# Altium footprint library MyPcbLib.PcbLib: 657 footprints (part 28 of 42)
Each footprint in its own frame and in the unit in brackets; x right, y up, seen from the top. Pads: shape width x height; smd on the part's side, far side on the other; paste and mask are expansions set on the pad; w line width, h text height; cw(c..) or ccw(c..) is an arc to the next point about the centre after c.
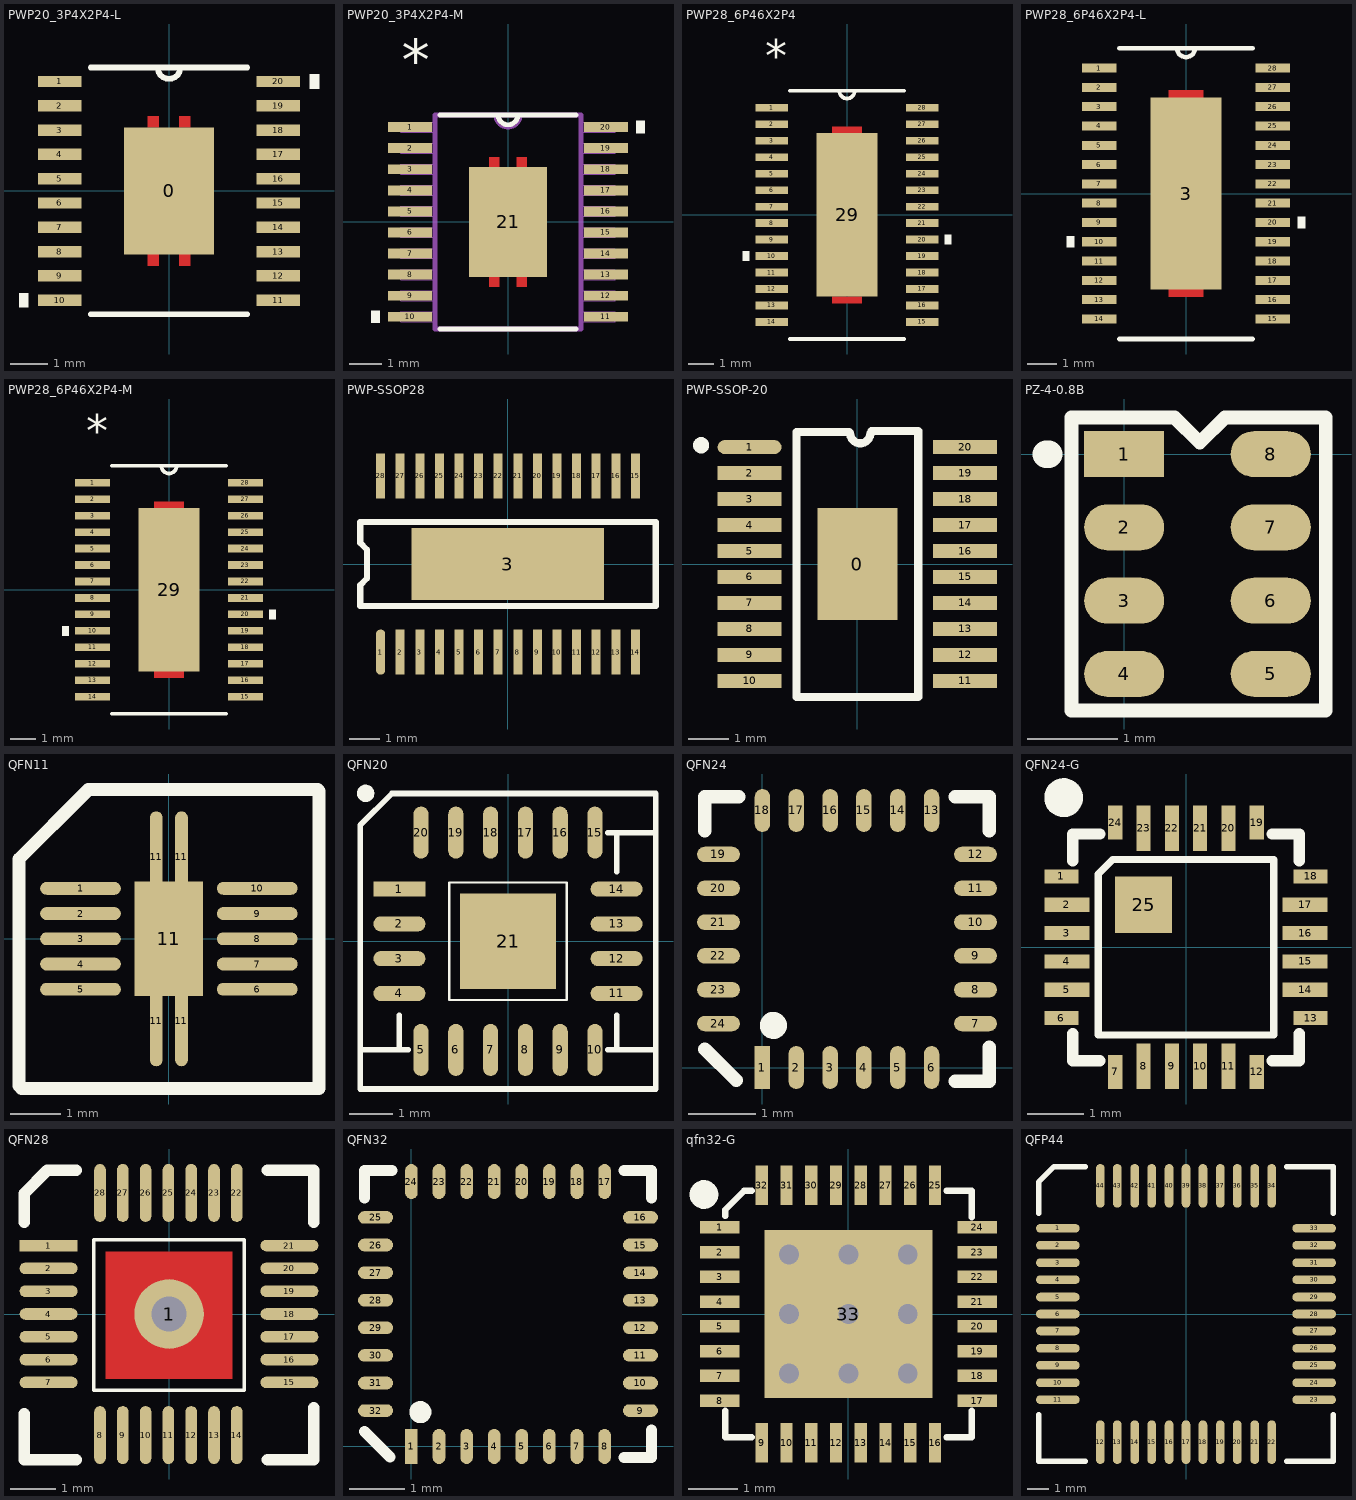
[diagram p27: the footprints below, top view; thin cyan lines are the x and y axes]

## PWP20_3P4X2P4-L [mil]
height 100
pads (21):
  rect 94.49x133.86 smd: 0(0,0)
  rect 46x12 smd: 1(-115,115.16) 2(-115,89.57) 3(-115,63.98) 4(-115,38.39) 5(-115,12.8) 6(-115,-12.8) 7(-115,-38.39) 8(-115,-63.98) 9(-115,-89.57) 10(-115,-115.16) 11(115,-115.16) 12(115,-89.57) 13(115,-63.98) 14(115,-38.39) 15(115,-12.8) 16(115,12.8) 17(115,38.39) 18(115,63.98) 19(115,89.57) 20(115,115.16)
Top Layer:
  region: 22.64,-66.93 10.83,-66.93 10.83,-78.74 22.64,-78.74
  region: -22.64,-66.93 -10.83,-66.93 -10.83,-78.74 -22.64,-78.74
  region: -22.64,66.93 -10.83,66.93 -10.83,78.74 -22.64,78.74
  region: 22.64,66.93 10.83,66.93 10.83,78.74 22.64,78.74
  region: 0,-66.93
  region: 0,66.93
Top Overlay:
  region: 148,122.66 158,122.66 158,107.66 148,107.66
  region: -148,-107.66 -158,-107.66 -158,-122.66 -148,-122.66
  lines w6: -82.33,-130 82.33,-130 ; -82.33,130 82.33,130 ; -12,130 ccw(c0,130) 12,130
Top Solder:
  region: 22.64,-66.93 10.83,-66.93 10.83,-78.74 22.64,-78.74
  region: -22.64,-66.93 -10.83,-66.93 -10.83,-78.74 -22.64,-78.74
  region: -22.64,66.93 -10.83,66.93 -10.83,78.74 -22.64,78.74
  region: 22.64,66.93 10.83,66.93 10.83,78.74 22.64,78.74
  region: 0,-66.93
  region: 0,66.93

## PWP20_3P4X2P4-M [mil]
height 100
pads (21):
  rect 54x12 smd: 1(-119,115.16) 2(-119,89.57) 3(-119,63.98) 4(-119,38.39) 5(-119,12.8) 6(-119,-12.8) 7(-119,-38.39) 8(-119,-63.98) 9(-119,-89.57) 10(-119,-115.16) 11(119,-115.16) 12(119,-89.57) 13(119,-63.98) 14(119,-38.39) 15(119,-12.8) 16(119,12.8) 17(119,38.39) 18(119,63.98) 19(119,89.57) 20(119,115.16)
  rect 94.49x133.86 smd: 21(0,0)
Top Layer:
  region: 0,66.93
  region: 0,-66.93
  region: 22.64,66.93 10.83,66.93 10.83,78.74 22.64,78.74
  region: -22.64,66.93 -10.83,66.93 -10.83,78.74 -22.64,78.74
  region: -22.64,-66.93 -10.83,-66.93 -10.83,-78.74 -22.64,-78.74
  region: 22.64,-66.93 10.83,-66.93 10.83,-78.74 22.64,-78.74
Top Overlay:
  region: -156,-107.66 -166,-107.66 -166,-122.66 -156,-122.66
  region: 156,122.66 166,122.66 166,107.66 156,107.66
  lines w6: -82.33,-130 82.33,-130 ; -82.33,130 82.33,130 ; -12,130 ccw(c0,130) 12,130
  text "*" at -129,172.16 h50
Top Solder:
  region: 0,66.93
  region: 0,-66.93
  region: 22.64,66.93 10.83,66.93 10.83,78.74 22.64,78.74
  region: -22.64,66.93 -10.83,66.93 -10.83,78.74 -22.64,78.74
  region: -22.64,-66.93 -10.83,-66.93 -10.83,-78.74 -22.64,-78.74
  region: 22.64,-66.93 10.83,-66.93 10.83,-78.74 22.64,-78.74
Mechanical 1:
  lines w0: -12,130 ccw(c0,130) 12,130 ; -130,-121.16 -130,-109.16 -88.5,-109.16 -88.5,-121.16 -130,-121.16 ; -130,-95.57 -130,-83.57 -88.5,-83.57 -88.5,-95.57 -130,-95.57 ; -130,-69.98 -130,-57.98 -88.5,-57.98 -88.5,-69.98 -130,-69.98 ; -130,-44.39 -130,-32.39 -88.5,-32.39 -88.5,-44.39 -130,-44.39 ; -130,-18.8 -130,-6.8 -88.5,-6.8 -88.5,-18.8 -130,-18.8 ; -130,6.8 -130,18.8 -88.5,18.8 -88.5,6.8 -130,6.8 ; -130,32.39 -130,44.39 -88.5,44.39 -88.5,32.39 -130,32.39 ; -130,57.98 -130,69.98 -88.5,69.98 -88.5,57.98 -130,57.98 ; -130,83.57 -130,95.57 -88.5,95.57 -88.5,83.57 -130,83.57 ; -130,109.16 -130,121.16 -88.5,121.16 -88.5,109.16 -130,109.16 ; -88.5,-130 88.5,-130 88.5,130 -88.5,130 -88.5,-130 ; 88.5,-121.16 88.5,-109.16 130,-109.16 130,-121.16 88.5,-121.16 ; 88.5,-95.57 88.5,-83.57 130,-83.57 130,-95.57 88.5,-95.57 ; 88.5,-69.98 88.5,-57.98 130,-57.98 130,-69.98 88.5,-69.98 ; 88.5,-44.39 88.5,-32.39 130,-32.39 130,-44.39 88.5,-44.39 ; 88.5,-18.8 88.5,-6.8 130,-6.8 130,-18.8 88.5,-18.8 ; 88.5,6.8 88.5,18.8 130,18.8 130,6.8 88.5,6.8 ; 88.5,32.39 88.5,44.39 130,44.39 130,32.39 88.5,32.39 ; 88.5,57.98 88.5,69.98 130,69.98 130,57.98 88.5,57.98 ; 88.5,83.57 88.5,95.57 130,95.57 130,83.57 88.5,83.57 ; 88.5,109.16 88.5,121.16 130,121.16 130,109.16 88.5,109.16
  lines w6: -14.75,130 ccw(c0,130) 14.75,130 ; -88.5,-130 -88.5,130 88.5,130 88.5,-130 -88.5,-130
  text "*" at -129,172.16 h50
  text "100" at 0,0 h50

## PWP28_6P46X2P4 [mil]
height 100
pads (29):
  rect 50x12 smd: 1(-117,166.34) 2(-117,140.75) 3(-117,115.16) 4(-117,89.57) 5(-117,63.98) 6(-117,38.39) 7(-117,12.8) 8(-117,-12.8) 9(-117,-38.39) 10(-117,-63.98) 11(-117,-89.57) 12(-117,-115.16) 13(-117,-140.75) 14(-117,-166.34) 15(117,-166.34) 16(117,-140.75) 17(117,-115.16) 18(117,-89.57) 19(117,-63.98) 20(117,-38.39) 21(117,-12.8) 22(117,12.8) 23(117,38.39) 24(117,63.98) 25(117,89.57) 26(117,115.16) 27(117,140.75) 28(117,166.34)
  rect 94.49x254.33 smd: 29(0,0)
Top Layer:
  region: 22.64,-127.17 -22.64,-127.17 -22.64,-137.01 22.64,-137.01 22.64,-127.17
  region: 22.64,127.17 -22.64,127.17 -22.64,137.01 22.64,137.01 22.64,127.17
Top Overlay:
  region: 152,-30.89 162,-30.89 162,-45.89 152,-45.89
  region: -152,-56.48 -162,-56.48 -162,-71.48 -152,-71.48
  lines w6: -88.5,-192.91 88.5,-192.91 ; -88.5,192.91 88.5,192.91 ; -12,192.91 ccw(c0,192.91) 12,192.91
  text "*" at -127,223.34 h50
Top Solder:
  region: 22.64,-127.17 -22.64,-127.17 -22.64,-137.01 22.64,-137.01 22.64,-127.17
  region: 22.64,127.17 -22.64,127.17 -22.64,137.01 22.64,137.01 22.64,127.17

## PWP28_6P46X2P4-L [mil]
height 100
pads (29):
  rect 46x12 smd: 1(-115,166.34) 2(-115,140.75) 3(-115,115.16) 4(-115,89.57) 5(-115,63.98) 6(-115,38.39) 7(-115,12.8) 8(-115,-12.8) 9(-115,-38.39) 10(-115,-63.98) 11(-115,-89.57) 12(-115,-115.16) 13(-115,-140.75) 14(-115,-166.34) 15(115,-166.34) 16(115,-140.75) 17(115,-115.16) 18(115,-89.57) 19(115,-63.98) 20(115,-38.39) 21(115,-12.8) 22(115,12.8) 23(115,38.39) 24(115,63.98) 25(115,89.57) 26(115,115.16) 27(115,140.75) 28(115,166.34)
  rect 94.49x254.33 smd: 3(0,0)
Top Layer:
  region: 22.64,127.17 -22.64,127.17 -22.64,137.01 22.64,137.01 22.64,127.17
  region: 22.64,-127.17 -22.64,-127.17 -22.64,-137.01 22.64,-137.01 22.64,-127.17
Top Overlay:
  region: -148,-56.48 -158,-56.48 -158,-71.48 -148,-71.48
  region: 148,-30.89 158,-30.89 158,-45.89 148,-45.89
  lines w6: -88.5,-192.91 88.5,-192.91 ; -88.5,192.91 88.5,192.91 ; -12,192.91 ccw(c0,192.91) 12,192.91
Top Solder:
  region: 22.64,127.17 -22.64,127.17 -22.64,137.01 22.64,137.01 22.64,127.17
  region: 22.64,-127.17 -22.64,-127.17 -22.64,-137.01 22.64,-137.01 22.64,-127.17

## PWP28_6P46X2P4-M [mil]
height 100
pads (29):
  rect 54x12 smd: 1(-119,166.34) 2(-119,140.75) 3(-119,115.16) 4(-119,89.57) 5(-119,63.98) 6(-119,38.39) 7(-119,12.8) 8(-119,-12.8) 9(-119,-38.39) 10(-119,-63.98) 11(-119,-89.57) 12(-119,-115.16) 13(-119,-140.75) 14(-119,-166.34) 15(119,-166.34) 16(119,-140.75) 17(119,-115.16) 18(119,-89.57) 19(119,-63.98) 20(119,-38.39) 21(119,-12.8) 22(119,12.8) 23(119,38.39) 24(119,63.98) 25(119,89.57) 26(119,115.16) 27(119,140.75) 28(119,166.34)
  rect 94.49x254.33 smd: 29(0,0)
Top Layer:
  region: 22.64,-127.17 -22.64,-127.17 -22.64,-137.01 22.64,-137.01 22.64,-127.17
  region: 22.64,127.17 -22.64,127.17 -22.64,137.01 22.64,137.01 22.64,127.17
Top Overlay:
  region: 156,-30.89 166,-30.89 166,-45.89 156,-45.89
  region: -156,-56.48 -166,-56.48 -166,-71.48 -156,-71.48
  lines w6: -88.5,-192.91 88.5,-192.91 ; -88.5,192.91 88.5,192.91 ; -12,192.91 ccw(c0,192.91) 12,192.91
  text "*" at -129,223.34 h50
Top Solder:
  region: 22.64,-127.17 -22.64,-127.17 -22.64,-137.01 22.64,-137.01 22.64,-127.17
  region: 22.64,127.17 -22.64,127.17 -22.64,137.01 22.64,137.01 22.64,127.17

## PWP-SSOP28 [mm]
pads (29):
  oval 0.3x1.5 smd: 1(-4.216,-2.921)
  rect 0.3x1.5 smd: 2(-3.566,-2.921) 3(-2.916,-2.921) 4(-2.266,-2.921) 5(-1.616,-2.921) 6(-0.966,-2.921) 7(-0.316,-2.921) 8(0.334,-2.921) 9(0.984,-2.921) 10(1.634,-2.921) 11(2.284,-2.921) 12(2.934,-2.921) 13(3.584,-2.921) 14(4.234,-2.921) 15(4.234,2.921) 16(3.584,2.921) 17(2.934,2.921) 18(2.284,2.921) 19(1.634,2.921) 20(0.984,2.921) 21(0.334,2.921) 22(-0.316,2.921) 23(-0.966,2.921) 24(-1.616,2.921) 25(-2.266,2.921) 26(-2.916,2.921) 27(-3.566,2.921) 28(-4.216,2.921)
  rect 6.4x2.4 smd: 3(0,0)
Top Overlay:
  lines w0.203: -4.891,-1.397 4.909,-1.397 4.909,1.397 -4.891,1.397 -4.891,0.699 -4.674,0.481 -4.674,-0.481 -4.891,-0.699 -4.891,-1.397

## PWP-SSOP-20 [mm]
pads (21):
  rect 2x2.8 smd: 0(0,0)
  oval 1.6x0.35 smd: 1(-2.696,2.925)
  rect 1.6x0.35 smd: 2(-2.696,2.275) 3(-2.696,1.625) 4(-2.696,0.975) 5(-2.696,0.325) 6(-2.696,-0.325) 7(-2.696,-0.975) 8(-2.696,-1.625) 9(-2.696,-2.275) 10(-2.696,-2.925) 11(2.696,-2.925) 12(2.696,-2.275) 13(2.696,-1.625) 14(2.696,-0.975) 15(2.696,-0.325) 16(2.696,0.325) 17(2.696,0.975) 18(2.696,1.625) 19(2.696,2.275) 20(2.696,2.925)
Top Overlay:
  circle w0.203: c-3.912,2.972 r0.102
  lines w0.203: -0.203,3.302 -1.524,3.302 -1.524,-3.327 1.524,-3.327 1.524,3.327 0.356,3.327 ; -0.181,3.277 ccw(c0.073,3.277) 0.327,3.277

## PZ-4-0.8B [mil]
height 9.5
pads (8):
  rect 35x20 smd: 1(0,0)
  oval 35x20 smd: 2(0,-32) 3(0,-64) 4(0,-96) 5(64,-96) 6(64,-64) 7(64,-32) 8(64,0)
Top Overlay:
  lines w6: -23,-112 88,-112 88,16 44,16 33,5 22,16 -23,16 -23,-112
  lines w12: -34,0 -33,0

## QFN11 [mm]
pads (15):
  oval 1.6x0.254 smd: 1(-1.75,1) 2(-1.75,0.5) 3(-1.75,0) 4(-1.75,-0.5) 5(-1.75,-1) 6(1.75,-1) 7(1.75,-0.5) 8(1.75,0) 9(1.75,0.5) 10(1.75,1)
  oval 0.254x1.8 smd: 11(-0.25,-1.625) 11(-0.25,1.625) 11(0.25,-1.625) 11(0.25,1.625)
  rect 1.36x2.27 smd: 11(0,0)
Top Overlay:
  lines w0.254: 2.593,-2.962 2.974,-2.962 2.974,2.905 ; 2.949,-2.937 2.924,-2.962 -2.918,-2.962 -2.969,-2.912 -2.969,1.584 -1.648,2.905 -1.598,2.956 2.949,2.956 2.974,2.93 2.974,2.753

## QFN20 [mm]
pads (21):
  rect 1.2x0.35 smd: 1(-2.5,1.2)
  oval 1.2x0.35 smd: 2(-2.5,0.4) 3(-2.5,-0.4) 4(-2.5,-1.2) 11(2.5,-1.2) 12(2.5,-0.4) 13(2.5,0.4) 14(2.5,1.2)
  oval 0.35x1.2 smd: 5(-2,-2.5) 6(-1.2,-2.5) 7(-0.4,-2.5) 8(0.4,-2.5) 9(1.2,-2.5) 10(2,-2.5) 15(2,2.5) 16(1.2,2.5) 17(0.4,2.5) 18(-0.4,2.5) 19(-1.2,2.5) 20(-2,2.5)
  rect 2.2x2.2 smd: 21(0,0)
Top Overlay:
  circle w0.2: c-3.277,3.404 r0.1
  lines w0.051: -1.35,-1.35 1.35,-1.35 1.35,1.35 -1.35,1.35 -1.35,-1.35
  lines w0.127: -3.4,-2.5 -2.3,-2.5 ; -2.5,-2.5 -2.5,-1.7 ; 2.3,-2.5 3.4,-2.5 ; 2.3,2.5 3.4,2.5 ; 2.5,-2.5 2.5,-1.7 ; 2.5,1.6 2.5,2.5 ; -3.4,-3.4 -3.4,2.671 -2.671,3.4 3.4,3.4 3.4,-3.4 -3.4,-3.4

## QFN24 [mm]
pads (24):
  rect 0.229x0.635 smd: 1(0,0)
  oval 0.229x0.635 smd: 2(0.5,0) 3(1,0) 4(1.5,0) 5(2,0) 6(2.5,0) 13(2.5,3.8) 14(2,3.8) 15(1.5,3.8) 16(1,3.8) 17(0.5,3.8) 18(0,3.8)
  oval 0.635x0.229 smd: 7(3.15,0.65) 8(3.15,1.15) 9(3.15,1.65) 10(3.15,2.15) 11(3.15,2.65) 12(3.15,3.15) 19(-0.65,3.15) 20(-0.65,2.65) 21(-0.65,2.15) 22(-0.65,1.65) 23(-0.65,1.15) 24(-0.65,0.65)
Top Overlay:
  circle w0.2: c0.162,0.622 r0.1
  lines w0.2: -0.85,0.272 -0.388,-0.19 ; -0.85,3.5 -0.85,4 -0.35,4 ; 2.85,-0.2 3.35,-0.2 3.35,0.3 ; 2.85,4 3.35,4 3.35,3.5

## QFN24-G [mm]
pads (25):
  rect 0.6x0.25 smd: 1(-2.201,1.25) 6(-2.201,-1.25) 13(2.201,-1.25) 18(2.201,1.25)
  rect 0.8x0.25 smd: 2(-2.101,0.75) 3(-2.101,0.25) 4(-2.101,-0.25) 5(-2.101,-0.75) 14(2.101,-0.75) 15(2.101,-0.25) 16(2.101,0.25) 17(2.101,0.75)
  rect 0.25x0.6 smd: 7(-1.25,-2.201) 12(1.25,-2.201) 19(1.25,2.201) 24(-1.25,2.201)
  rect 0.25x0.8 smd: 8(-0.75,-2.101) 9(-0.25,-2.101) 10(0.25,-2.101) 11(0.75,-2.101) 20(0.75,2.101) 21(0.25,2.101) 22(-0.25,2.101) 23(-0.75,2.101)
  rect 1x1 smd: 25(-0.75,0.75)
Top Overlay:
  circle w0.381: c-2.159,2.642 r0.152
  lines w0.127: -1.55,-1.55 1.55,-1.55 1.55,1.55 -1.295,1.55 -1.55,1.295 -1.55,-1.55
  lines w0.2: -2,-1.525 -2,-2 -1.525,-2 ; -2,1.525 -2,2 -1.525,2 ; 1.525,-2 2,-2 2,-1.525 ; 1.525,2 2,2 2,1.525

## QFN28 [mil]
pads (29):
  rect 50x10 smd: 1(-104,59.05)
  round 60 hole 30: 1(0,0)
  oval 50x10 smd: 2(-104,39.37) 3(-104,19.68) 4(-104,0) 5(-104,-19.68) 6(-104,-39.37) 7(-104,-59.05) 15(103.98,-59.05) 16(103.98,-39.37) 17(103.98,-19.68) 18(103.98,0) 19(103.98,19.68) 20(103.98,39.37) 21(103.98,59.05)
  oval 10x50 smd: 8(-59.57,-104.49) 9(-39.88,-104.49) 10(-20.2,-104.49) 11(-0.51,-104.49) 12(19.17,-104.49) 13(38.86,-104.49) 14(58.54,-104.49) 22(58.54,104.49) 23(38.86,104.49) 24(19.17,104.49) 25(-0.51,104.49) 26(-20.2,104.49) 27(-39.88,104.49) 28(-59.57,104.49)
Top Layer:
  rectangle: -55,-55.95 55,54.05
Top Overlay:
  lines w3: -65,-65.94 65,-65.94 65,64.06 -65,64.06 -65,-65.94
  lines w10: -125,-125.94 -125,-85.94 ; -125,79.06 -125,104.06 -105,124.06 -80,124.06 ; -123,-125.94 -80,-125.94 ; 85,-125.94 125,-125.94 125,-80.94 ; 85,124.06 125,124.06 125,79.06

## QFN32 [mm]
pads (32):
  rect 0.229x0.635 smd: 1(0,0)
  oval 0.229x0.635 smd: 2(0.5,0) 3(1,0) 4(1.5,0) 5(2,0) 6(2.5,0) 7(3,0) 8(3.5,0) 17(3.5,4.8) 18(3,4.8) 19(2.5,4.8) 20(2,4.8) 21(1.5,4.8) 22(1,4.8) 23(0.5,4.8) 24(0,4.8)
  oval 0.635x0.229 smd: 9(4.15,0.65) 10(4.15,1.15) 11(4.15,1.65) 12(4.15,2.15) 13(4.15,2.65) 14(4.15,3.15) 15(4.15,3.65) 16(4.15,4.15) 25(-0.65,4.15) 26(-0.65,3.65) 27(-0.65,3.15) 28(-0.65,2.65) 29(-0.65,2.15) 30(-0.65,1.65) 31(-0.65,1.15) 32(-0.65,0.65)
Top Overlay:
  circle w0.2: c0.162,0.622 r0.1
  lines w0.2: -0.85,0.272 -0.388,-0.19 ; -0.85,4.5 -0.85,5 -0.35,5 ; 3.85,-0.2 4.35,-0.2 4.35,0.3 ; 3.85,5 4.35,5 4.35,4.5

## qfn32-G [mm]
pads (33):
  rect 0.8x0.25 smd: 1(-2.601,1.75) 2(-2.601,1.25) 3(-2.601,0.75) 4(-2.601,0.25) 5(-2.601,-0.25) 6(-2.601,-0.75) 7(-2.601,-1.25) 8(-2.601,-1.75) 17(2.601,-1.75) 18(2.601,-1.25) 19(2.601,-0.75) 20(2.601,-0.25) 21(2.601,0.25) 22(2.601,0.75) 23(2.601,1.25) 24(2.601,1.75)
  rect 0.25x0.8 smd: 9(-1.75,-2.601) 10(-1.25,-2.601) 11(-0.75,-2.601) 12(-0.25,-2.601) 13(0.25,-2.601) 14(0.75,-2.601) 15(1.25,-2.601) 16(1.75,-2.601) 25(1.75,2.601) 26(1.25,2.601) 27(0.75,2.601) 28(0.25,2.601) 29(-0.25,2.601) 30(-0.75,2.601) 31(-1.25,2.601) 32(-1.75,2.601)
  rect 3.4x3.4 smd: 33(0,0)
via -1.2,1.2 diameter 0.7 hole 0.4
via 0,1.2 diameter 0.7 hole 0.4
via 1.2,1.2 diameter 0.7 hole 0.4
via -1.2,0 diameter 0.7 hole 0.4
via 0,0 diameter 0.7 hole 0.4
via 1.2,0 diameter 0.7 hole 0.4
via -1.2,-1.2 diameter 0.7 hole 0.4
via 0,-1.2 diameter 0.7 hole 0.4
via 1.2,-1.2 diameter 0.7 hole 0.4
Top Overlay:
  circle w0.3: c-2.919,2.413 r0.14
  lines w0.127: -2.489,-1.956 -2.489,-2.489 -1.956,-2.489 ; -2.489,1.981 -2.489,2.108 -2.108,2.489 -1.956,2.489 ; 1.981,-2.489 2.489,-2.489 2.489,-1.956 ; 1.981,2.489 2.489,2.489 2.489,1.956
Mechanical 15:
  lines w0.1: -0.5,0 0.5,0 ; 0,-0.5 0,0.5

## QFP44 [mil]
pads (44):
  oval 80x16 smd: 1(-235,157) 2(-235,126) 3(-235,94) 4(-235,63) 5(-235,31) 6(-235,0) 7(-235,-31) 8(-235,-63) 9(-235,-94) 10(-235,-126) 11(-235,-157) 23(235,-157) 24(235,-126) 25(235,-94) 26(235,-63) 27(235,-31) 28(235,0) 29(235,31) 30(235,63) 31(235,94) 32(235,126) 33(235,157)
  oval 16x80 smd: 12(-157,-235) 13(-126,-235) 14(-94,-235) 15(-63,-235) 16(-31,-235) 17(0,-235) 18(31,-235) 19(63,-235) 20(94,-235) 21(126,-235) 22(157,-235) 34(157,235) 35(126,235) 36(94,235) 37(63,235) 38(31,235) 39(0,235) 40(-31,235) 41(-63,235) 42(-94,235) 43(-126,235) 44(-157,235)
Top Overlay:
  lines w10: -270,-185 -270,-270 -185,-270 ; -270,185 -270,242 -242,270 -185,270 ; 185,-270 270,-270 270,-185 ; 185,270 270,270 270,185
3D body: height 71.09, standoff 0.22, extent -236.22,-236.22 236.22,236.22